# Altium footprint library JL_PCB.PCBLIB: 1112 footprints (part 70 of 71)
Each footprint in its own frame and in the unit in brackets; x right, y up, seen from the top. Pads: shape width x height; smd on the part's side, far side on the other; paste and mask are expansions set on the pad; w line width, h text height; cw(c..) or ccw(c..) is an arc to the next point about the centre after c.
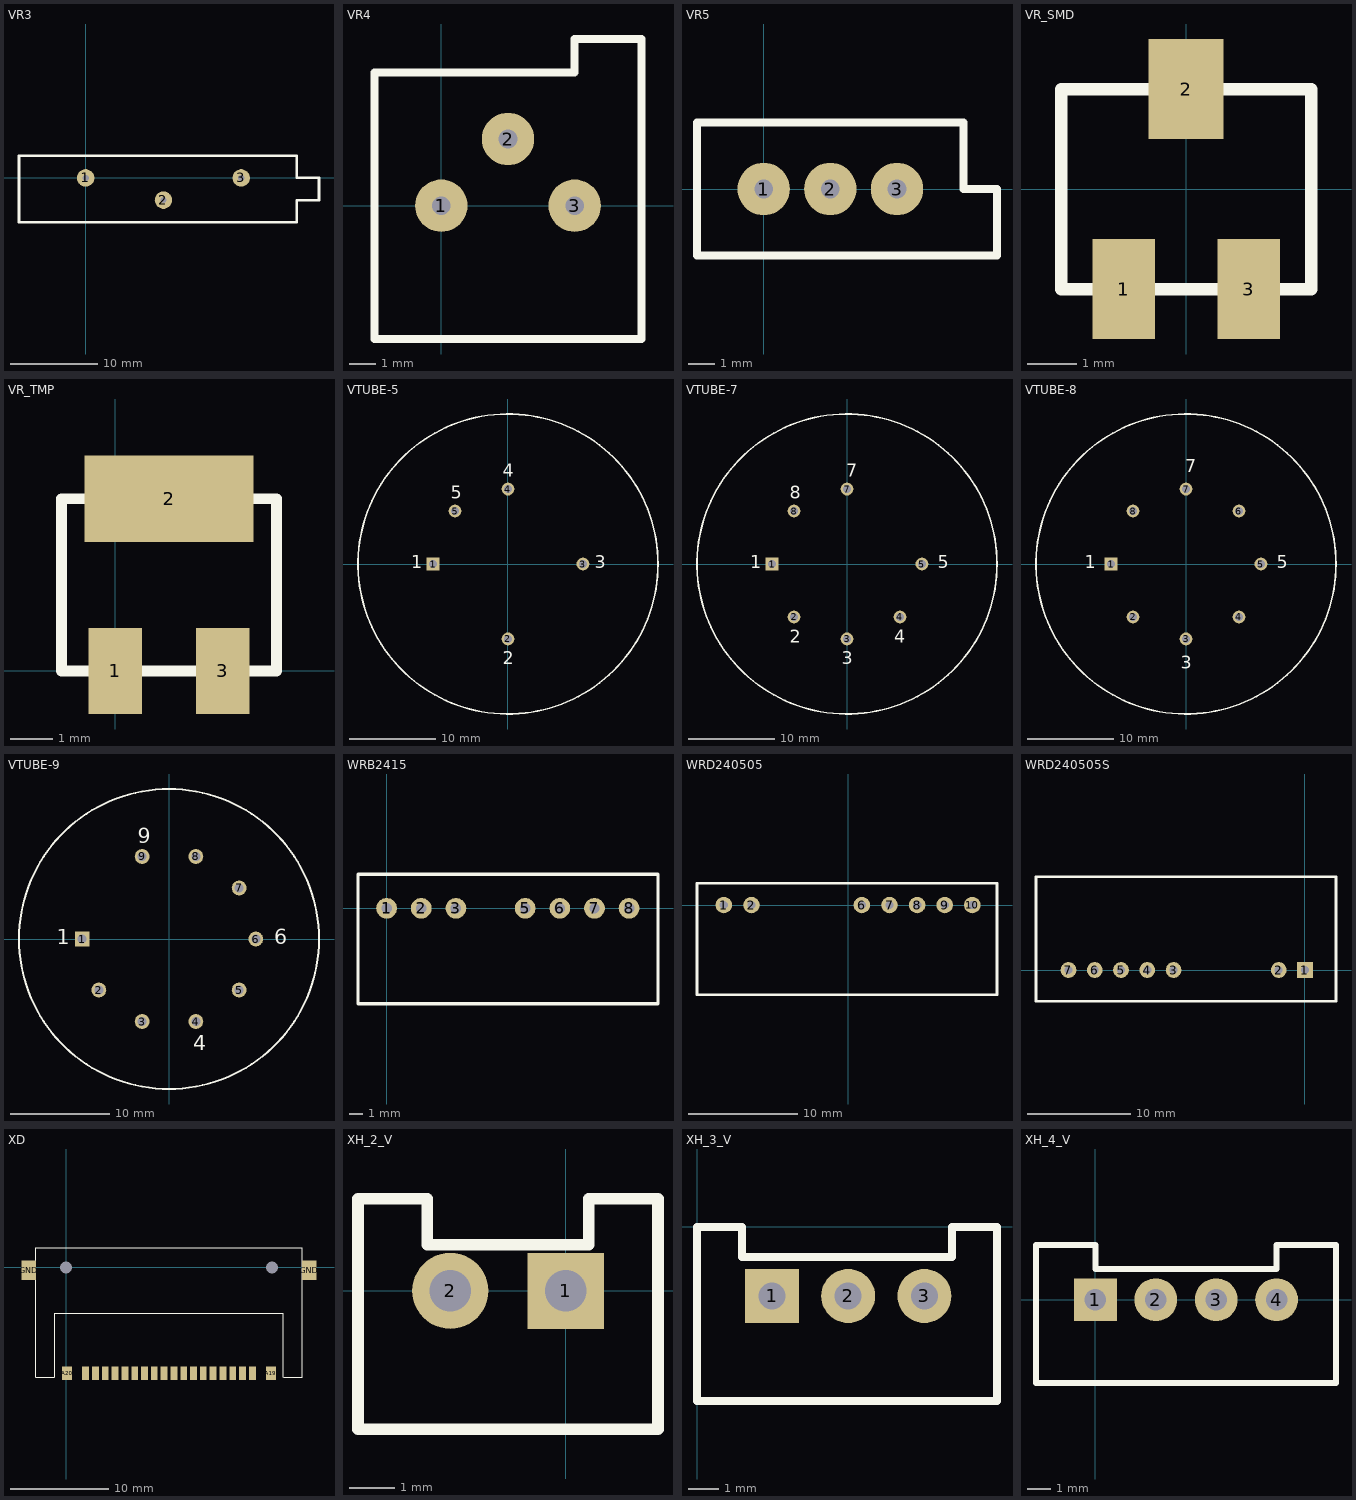
[diagram p69: the footprints below, top view; thin cyan lines are the x and y axes]

## VR3 [mm]
pads (3):
  round 2 hole 0.711: 1(0,0) 2(8.89,-2.54) 3(17.78,0)
TopOverlay:
  lines w0.305: -7.62,-5.08 -7.62,2.54 24.13,2.54 24.13,0 26.67,0 26.67,-2.54 24.13,-2.54 24.13,-5.08 -7.62,-5.08

## VR4 [mm]
pads (3):
  round 2 hole 0.711: 1(0,0) 2(2.54,2.54) 3(5.08,0)
TopOverlay:
  lines w0.305: -2.54,-5.08 -2.54,5.08 5.08,5.08 5.08,6.35 7.62,6.35 7.62,-5.08 -2.54,-5.08

## VR5 [mm]
pads (3):
  round 2 hole 0.711: 1(0,0) 2(2.54,0) 3(5.08,0)
TopOverlay:
  lines w0.305: -2.54,-2.54 -2.54,2.54 7.62,2.54 7.62,0 8.89,0 8.89,-2.54 -2.54,-2.54

## VR_SMD [mil]
pads (3):
  rect 50x80 smd: 1(-50,-80) 3(50,-80)
  rect 60x80 smd: 2(0,80)
TopOverlay:
  lines w10: -100,-80 -100,80 100,80 100,-80 -100,-80

## VR_TMP [mil]
pads (3):
  rect 50x80 smd: 1(0,0) 3(100,0)
  rect 157.48x80 smd: 2(50,160)
TopOverlay:
  lines w10: -50,0 150,0 150,160 -50,160 -50,0

## VTUBE-5 [mm] "Thyratron; 5 Leads"
pads (5):
  rect 1.5x1.5 hole 0.9: 1(-8.725,0)
  round 1.5 hole 0.9: 2(0,-8.725) 3(8.725,0) 4(0,8.725) 5(-6.17,6.17)
TopOverlay:
  circle w0.2: c0,0 r17.462
  text "3" at 10.071,-0.508 h1.5
  text "5" at -6.693,7.62 h1.5
  text "4" at -0.597,10.16 h1.5
  text "2" at -0.597,-11.684 h1.5
  text "1" at -11.265,-0.508 h1.5

## VTUBE-7 [mm] "Beam Power Pentode; 7 Leads"
height 108
pads (7):
  rect 1.5x1.5 hole 0.9: 1(-8.725,0)
  round 1.5 hole 0.9: 2(-6.17,-6.17) 3(0,-8.725) 4(6.17,-6.17) 5(8.725,0) 7(0,8.725) 8(-6.17,6.17)
TopOverlay:
  circle w0.2: c0,0 r17.462
  text "8" at -6.693,7.62 h1.5
  text "7" at -0.089,10.16 h1.5
  text "5" at 10.579,-0.508 h1.5
  text "4" at 5.499,-9.144 h1.5
  text "3" at -0.597,-11.684 h1.5
  text "2" at -6.693,-9.144 h1.5
  text "1" at -11.265,-0.508 h1.5

## VTUBE-8 [mm] "Medium Mu Dual Triode; 8 Leads"
height 108
pads (8):
  rect 1.5x1.5 hole 0.9: 1(-8.725,0)
  round 1.5 hole 0.9: 2(-6.17,-6.17) 3(0,-8.725) 4(6.17,-6.17) 5(8.725,0) 6(6.17,6.17) 7(0,8.725) 8(-6.17,6.17)
TopOverlay:
  circle w0.2: c0,0 r17.462
  text "7" at -0.089,10.668 h1.5
  text "5" at 10.579,-0.508 h1.5
  text "3" at -0.597,-12.192 h1.5
  text "1" at -11.773,-0.508 h1.5

## VTUBE-9 [mm] "Medium Mu Dual Triode; 9 Leads"
height 55.6
pads (9):
  rect 1.5x1.5 hole 0.9: 1(-8.725,0)
  round 1.5 hole 0.9: 2(-7.059,-5.128) 3(-2.696,-8.298) 4(2.696,-8.298) 5(7.059,-5.128) 6(8.725,0) 7(7.059,5.128) 8(2.696,8.298) 9(-2.696,8.298)
TopOverlay:
  circle w0.2: c0,0 r15.081
  text "4" at 2.451,-11.176 h1.5
  text "6" at 10.579,-0.508 h1.5
  text "9" at -3.137,9.652 h1.5
  text "1" at -11.265,-0.508 h1.5

## WRB2415 [mil]
pads (7):
  round 60 hole 30: 1(0,0) 2(100,0) 3(200,0) 5(400,0) 6(500,0) 7(600,0) 8(700,0)
TopOverlay:
  lines w10: -82.68,-275.59 783.46,-275.59 783.46,98.43 -82.68,98.43 -82.68,-275.59

## WRD240505 [mil]
pads (7):
  round 60 hole 30: 1(-451,0) 2(-351,0) 6(49,0) 7(149,0) 8(249,0) 9(349,0) 10(449,0)
TopOverlay:
  lines w10: -548.31,-324.8 538.31,-324.8 538.31,78.74 -548.31,78.74 -548.31,-324.8

## WRD240505S [mil]
pads (7):
  rect 60x60 hole 30: 1(0,0)
  round 60 hole 30: 2(-100,0) 3(-500,0) 4(-600,0) 5(-700,0) 6(-800,0) 7(-900,0)
TopOverlay:
  lines w10: -1023.62,-118.11 -1023.62,354.33 -984.25,354.33 78.74,354.33 118.11,354.33 118.11,314.96 118.11,0 118.11,-118.11 -1023.62,-118.11

## XD [mm]
pads (24):
  round 0 hole 1.2 unplated: 0(21,0) 1(0,0)
  rect 0.7x1.4 smd: A1(19,-10.8) A2(18,-10.8) A3(17,-10.8) A4(16,-10.8) A5(15,-10.8) A6(14,-10.8) A7(13,-10.8) A8(12,-10.8) A9(11,-10.8) A10(10,-10.8) A11(9,-10.8) A12(8,-10.8) A13(7,-10.8) A14(6,-10.8) A15(5,-10.8) A16(4,-10.8) A17(3,-10.8) A18(2,-10.8)
  rect 1x1.4 smd: A19(20.9,-10.8) A20(0.1,-10.8)
  rect 1.5x2 smd: GND(-3.8,-0.3) GND(24.8,-0.3)
TopOverlay:
  lines w0.127: -1.2,-11.19 -3.1,-11.19 -3.1,2.01 24.1,2.01 24.1,-11.19 22.2,-11.19 ; -1.16,-11.19 -1.16,-4.69 22.14,-4.69 22.14,-11.19

## XH_2_V [mil]
pads (2):
  rect 66x66 hole 36: 1(0,0)
  round 66 hole 36: 2(-100,0)
TopOverlay:
  lines w10: -180,-120 80,-120 80,0 80,80 20,80 20,40 -120,40 -120,80 -180,80 -180,-120
3D body "XH-2A.STEP": height 276.19, standoff -133.26, extent -195.67,-133.86 95.67,92.52

## XH_3_V [mm]
height 7
pads (3):
  rect 1.8x1.8 hole 0.9: 1(2.5,-2.3)
  round 1.8 hole 0.9: 2(5.04,-2.3) 3(7.58,-2.3)
TopOverlay:
  lines w0.254: 0,-5.791 0,-5.8 ; 0,-5.8 0,0 1.5,0 1.5,-1 8.5,-1 8.5,0 10,0 10,-5.8 0,-5.8
3D body "XH-3A.STEP": height 7.02, standoff -3.38, extent 0.09,-5.7 9.99,0.05

## XH_4_V [mm]
pads (4):
  rect 1.8x1.8 hole 0.9: 1(0,0)
  round 1.8 hole 0.9: 2(2.54,0) 3(5.08,0) 4(7.62,0)
TopOverlay:
  lines w0.254: -2.5,-3.491 -2.5,-3.5 ; -2.5,-3.5 -2.5,2.3 0,2.3 0,1.3 7.62,1.3 7.62,2.3 10.12,2.3 10.12,-3.5 -2.5,-3.5
3D body "XH-3A.STEP": height 7.02, standoff -3.38, extent -2.41,-3.4 7.49,2.35